# Altium schematic symbol library 724452_RPL-HX_Mobile_AEP_Rev0p91_Library.SchLib: 162 symbols (part 1 of 5)
Pins are listed as number, name and electrical type; pins without a type are passive.

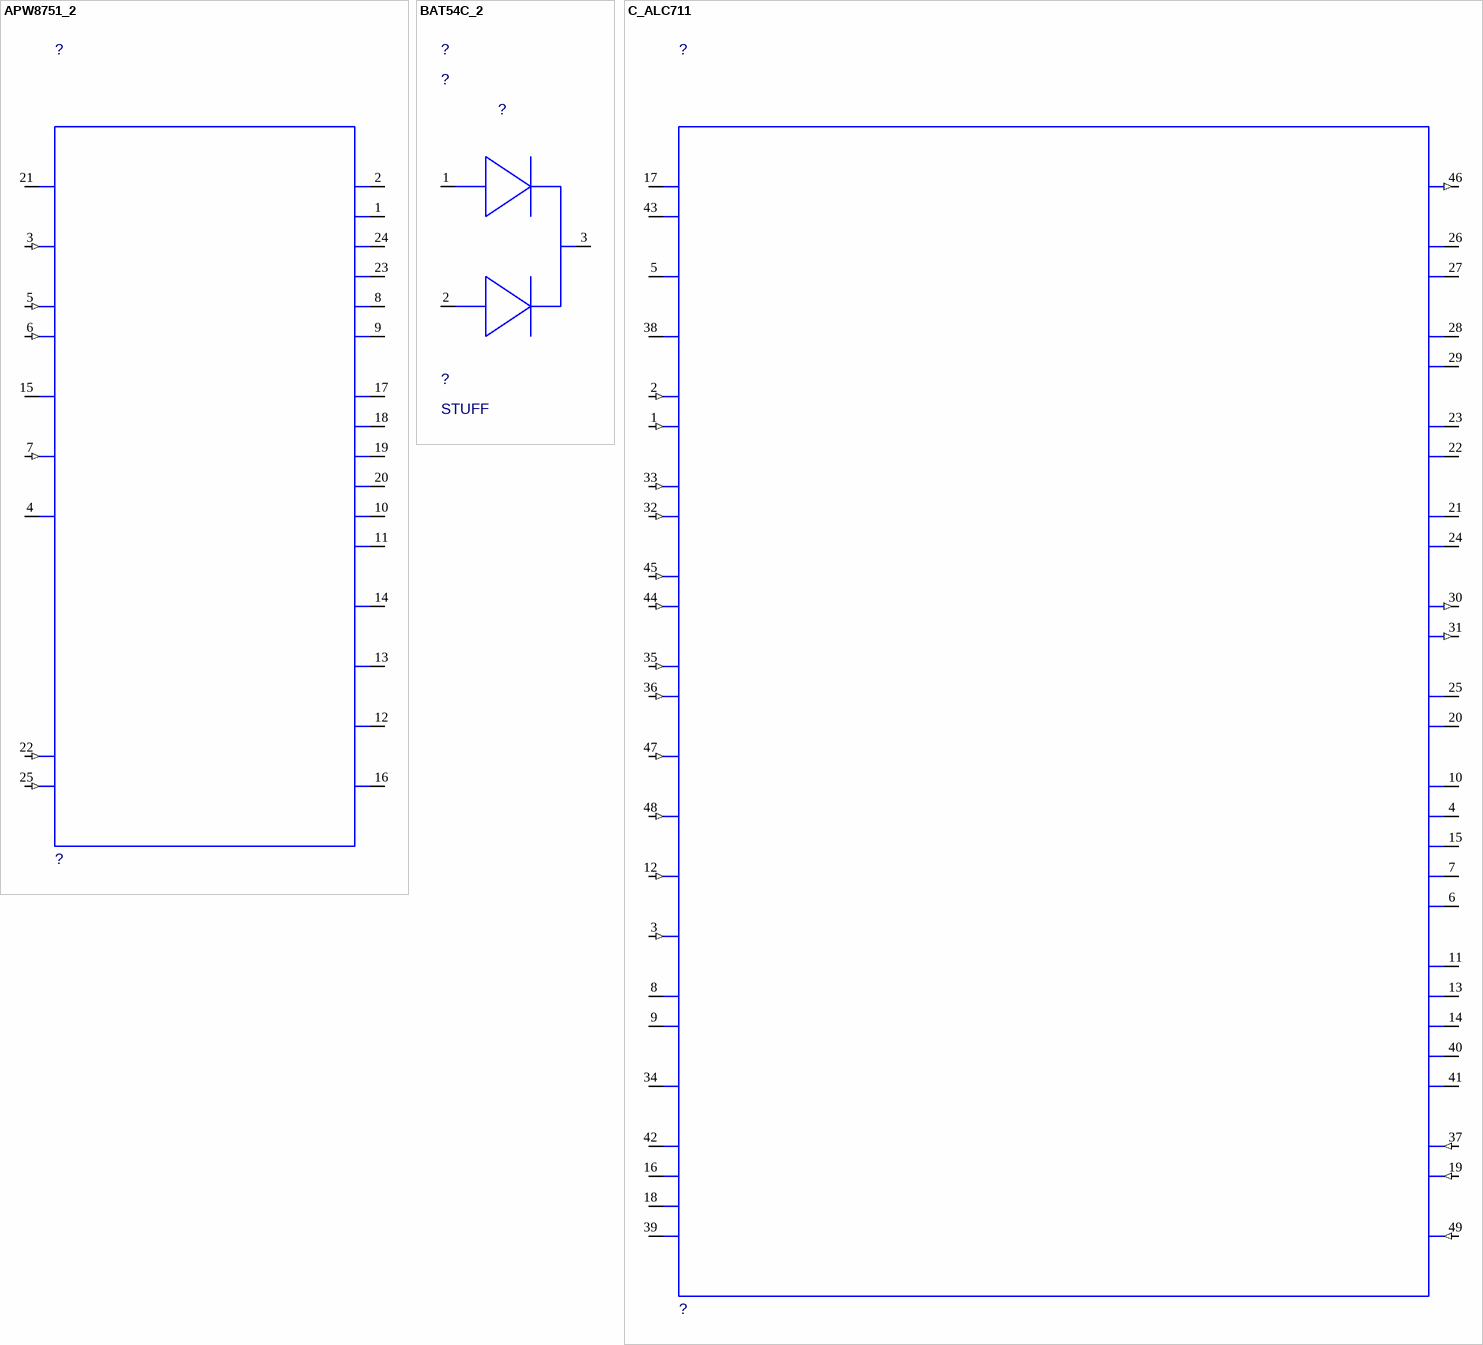
[diagram p0: symbols APW8751_2 to C_ALC711]

## APW8751_2
designator ?  (value not drawn)
CDS_LMAN_SYM_OUTLINE: -250,600,250,-600; ROOM: NONE; OriginalSymbolOrigin: (-275,600); FP_TECH: ?; IP: ?; PACK_TYPE: ?; VARIANT: ?; MATERIAL: ?; PART_NUMBER: ?
pins: 1 BOOT1 (io), 2 UGATE1 (io), 3 EN (in), 4 PSI (io), 5 VID1 (in), 6 VID0 (in), 7 FS (in), 8 CSP1 (io), 9 CSN1 (io), 10 CSP2 (io), 11 CSN2 (io), 12 GNDSNS (io), 13 VSNS (io), 14 VDROOP (io), 15 COMP (io), 16 POK (io), 17 UGATE2 (io), 18 BOOT2 (io), 19 PHASE2 (io), 20 LGATE2 (io), 21 VCC (power), 22 GND (in), 23 LGATE1 (io), 24 PHASE1 (io), 25 PGND_TPD (in)

## BAT54C_2
designator ?, comment ?  BOM_USE: STUFF
CDS_LMAN_SYM_OUTLINE: -100,150,50,-150; ROOM: NONE; OriginalSymbolOrigin: (-125,150); CURRENT: ?; FP_TECH: ?; IP: ?; MATERIAL: ?; PACK_TYPE: ?; PART_NUMBER: ?; VARIANT: ?
pins: 1 A1 (io), 2 A2 (io), 3 C (io)

## C_ALC711
designator ?  (value not drawn)
CDS_LMAN_SYM_OUTLINE: -650,1000,600,-950; ROOM: NONE; OriginalSymbolOrigin: (-675,1000); FP_TECH: ?; IP: ?; MATERIAL: ?; PACK_TYPE: ?; PART_NUMBER: ?; VARIANT: ?
pins: 1 CC1 (in), 2 CC2 (in), 3 RTCLK (in), 4 GPIO3 (io), 5 DVDD (power), 6 GPIO0_DMIC_DATA12 (io), 7 GPIO1_DMIC_CLK (io), 8 SDW_DAT (io), 9 SDW_CLK (io), 10 SCP_ID0_GPIO4 (io), 11 NC_1 (io), 12 SCP_ID1 (in), 13 NC_2 (io), 14 NC_3 (io), 15 GPIO2_DMIC_DATA34 (io), 16 LDO3_CAP (io), 17 AVDD2 (power), 18 LDO2_CAP (io), 19 AVSS2 (in), 20 CPVEE (io), 21 CBP (io), 22 CBN2 (io), 23 CBP2 (io), 24 CBN (io), 25 CPVPP (io), 26 HPOUT_R_PORT_I_R (io), 27 HPOUT_L_PORT_I_L (io), 28 USB_DP_IN (io), 29 USB_DN_IN (io), 30 MIC2_VREFO_L (out), 31 MIC2_VREFO_R (out), 32 RING2_MIC2_L_PORT_F_L (in), 33 SLEEVE_MIC2_R_PORT_F_R (in), 34 MIC2_CAP (io), 35 LINE1_R_PORT_C_R (in), 36 LINE1_L_PORT_C_L (in), 37 AVSS1 (in), 38 VREF (io), 39 LDO1_CAP (io), 40 NC_4 (io), 41 NC_5 (io), 42 LDO4_CAP (io), 43 AVDD1 (power), 44 LINE2_L_PORT_E_L (in), 45 LINE2_R_PORT_E_R (in), 46 LINE2_VREFO (out), 47 LINE2_JD (in), 48 AGPI (in), 49 DGND_TPD (in)

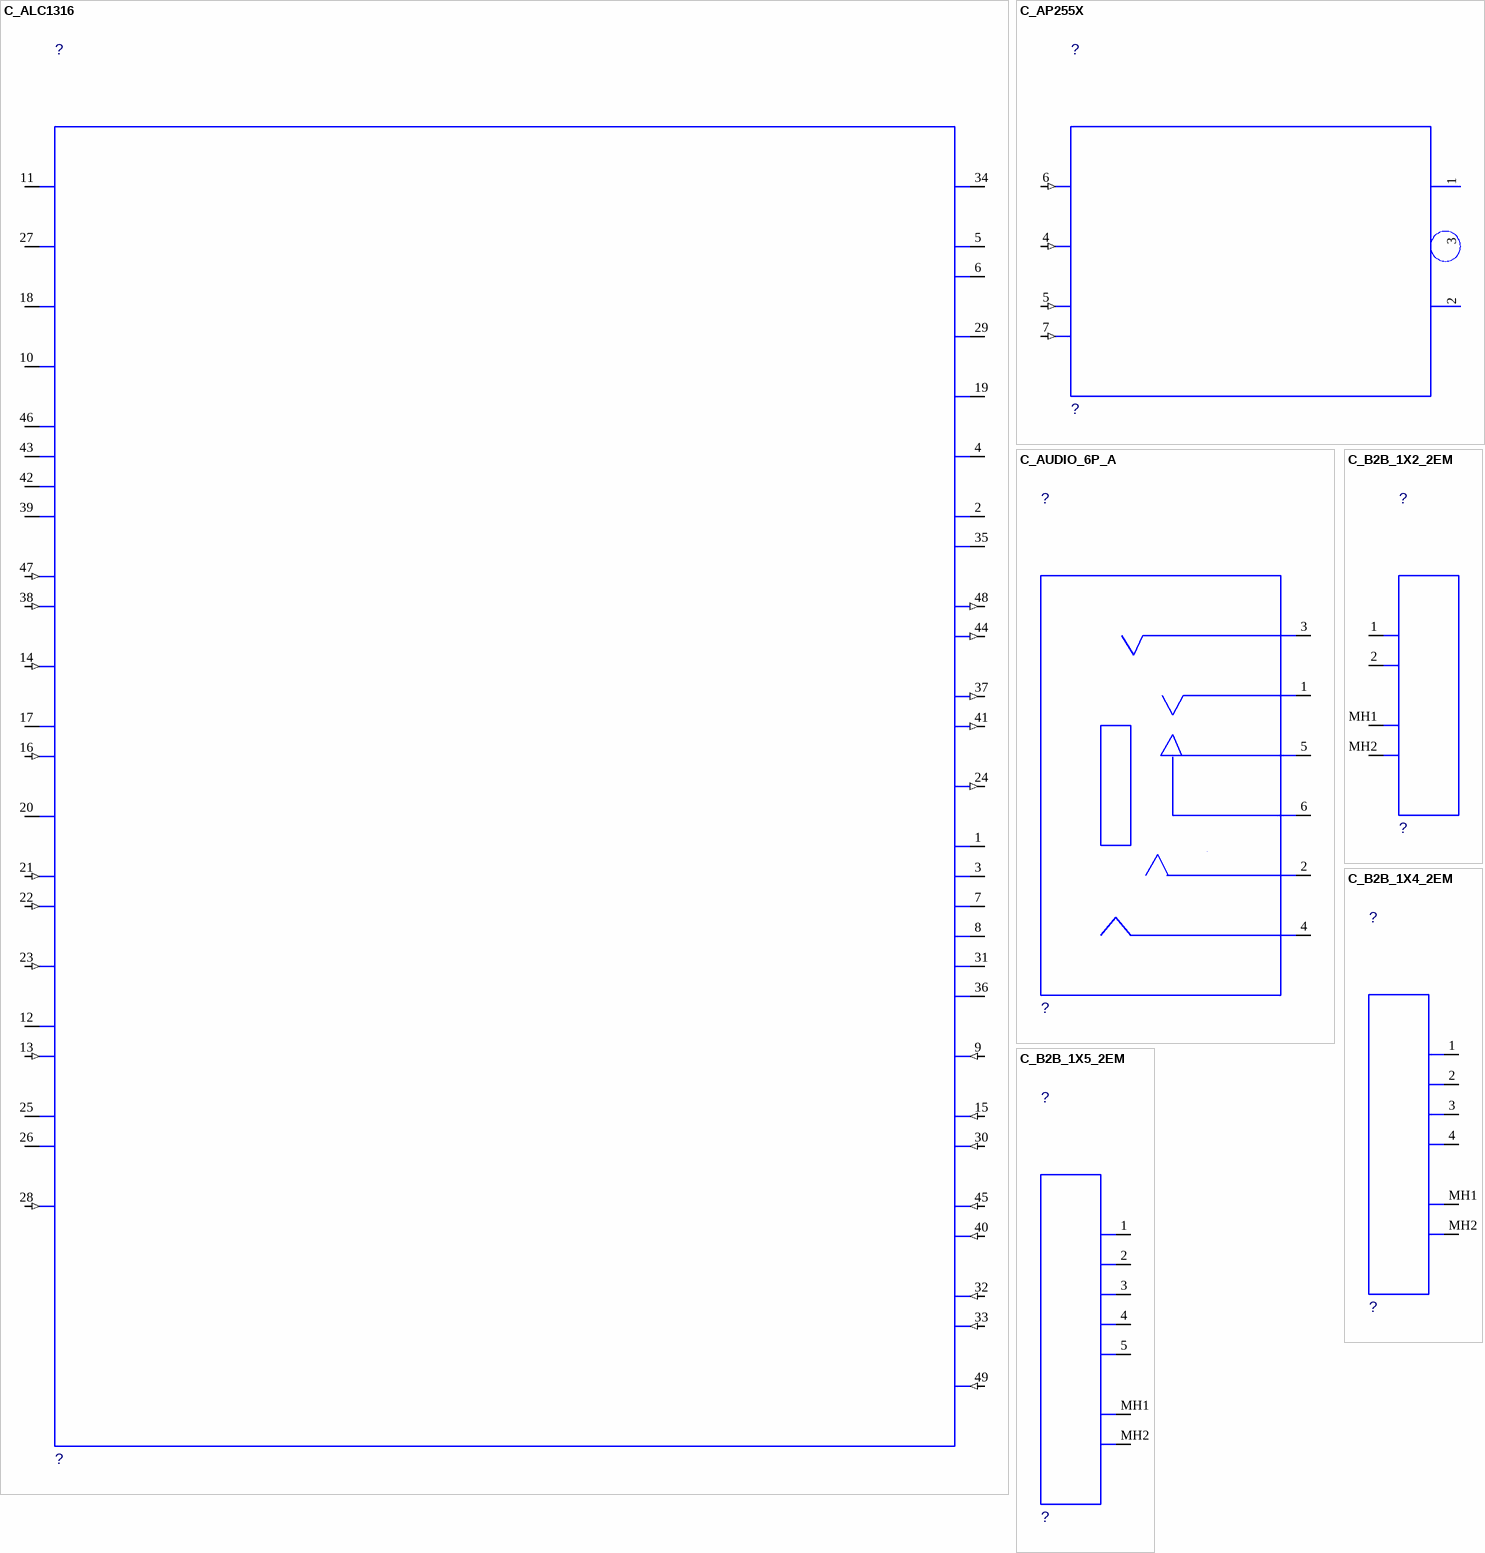
[diagram p1: symbols C_ALC1316 to C_B2B_1X5_2EM]

## C_ALC1316
designator ?  (value not drawn)
CDS_LMAN_SYM_OUTLINE: -750,1100,750,-1100; ROOM: NONE; OriginalSymbolOrigin: (-775,1100); FP_TECH: ?; IP: ?; MATERIAL: ?; PACK_TYPE: ?; PART_NUMBER: ?; VARIANT: ?
pins: 1 NC_1 (io), 2 PVDD_AB (power), 3 NC_2 (io), 4 GVDD_OUT (power), 5 AVDD_5 (power), 6 AVDD_33 (power), 7 NC_3 (io), 8 NC_4 (io), 9 AGND (in), 10 HV_45_CAP (power), 11 VREF (power), 12 SDA (io), 13 SCL (in), 14 PDB (in), 15 DGND (in), 16 SDW_CLK (in), 17 SDW_DAT (io), 18 SDW_IO_18 (power), 19 DVDD_IO (power), 20 MCLK_SDW_TOH_MODE_VI_DAT_SYNC (io), 21 LRCK_SDW_TOH1 (in), 22 BCLK_SDW_TOH0 (in), 23 DACDAT_SDW_SR1 (in), 24 ADCDAT_SDW_SR0 (out), 25 ASEL0_VI_DAT_SYNC (io), 26 ASEL1 (io), 27 D_REG_18 (power), 28 MULTI_SPK (in), 29 DVDD_33 (power), 30 DGND_LV (in), 31 NC_5 (io), 32 VSS_SUB (in), 33 VSS_ANA (in), 34 AVCC (power), 35 PVDD_CD (power), 36 NC_6 (io), 37 OUTD_P_LCH (out), 38 L_ISENSE (in), 39 BST_D (power), 40 PGND_CD (in), 41 OUTC_N_LCH (out), 42 BST_C (power), 43 BST_B (power), 44 OUTB_N_RCH (out), 45 PGND_AB (in), 46 BST_A (power), 47 R_ISENSE (in), 48 OUTA_P_RCH (out), 49 GND_TPD (in)

## C_AP255X
designator ?  (value not drawn)
CDS_LMAN_SYM_OUTLINE: -300,250,300,-200; ROOM: NONE; OriginalSymbolOrigin: (-325,250); FP_TECH: ?; IP: ?; MATERIAL: ?; PACK_TYPE: ?; PART_NUMBER: ?; VARIANT: ?
pins: 1 OUT (out), 2 ILIM (out), 3 FAULT_N (out), 4 EN_N_EN (in), 5 GND (in), 6 IN (in), 7 GND_TPD (in)

## C_AUDIO_6P_A
designator ?  (value not drawn)
CDS_LMAN_SYM_OUTLINE: -200,350,200,-350; ROOM: NONE; OriginalSymbolOrigin: (-200,350); FP_TECH: ?; IP: ?; MATERIAL: ?; PACK_TYPE: ?; PART_NUMBER: ?; VARIANT: ?
pins: 1 L_R (io), 2 R_L (io), 3 G_M (io), 4 M_G (io), 5 GND_1 (io), 6 GND_2 (io)

## C_B2B_1X2_2EM
designator ?  (value not drawn)
CDS_LMAN_SYM_OUTLINE: -50,200,50,-200; ROOM: NONE; OriginalSymbolOrigin: (-75,200); FP_TECH: ?; IP: ?; PACK_TYPE: ?; VARIANT: ?; MATERIAL: ?; PART_NUMBER: ?
pins: 1 IO1 (io), 2 IO2 (io), MH1 (io), MH2 (io)

## C_B2B_1X4_2EM
designator ?  (value not drawn)
CDS_LMAN_SYM_OUTLINE: -50,250,50,-250; ROOM: NONE; OriginalSymbolOrigin: (-50,250); FP_TECH: ?; IP: ?; MATERIAL: ?; PACK_TYPE: ?; PART_NUMBER: ?; VARIANT: ?
pins: 1 IO1 (io), 2 IO2 (io), 3 IO3 (io), 4 IO4 (io), MH1 (io), MH2 (io)

## C_B2B_1X5_2EM
designator ?  (value not drawn)
CDS_LMAN_SYM_OUTLINE: -50,300,50,-250; ROOM: NONE; OriginalSymbolOrigin: (-50,300); FP_TECH: ?; IP: ?; MATERIAL: ?; PACK_TYPE: ?; PART_NUMBER: ?; VARIANT: ?
pins: 1 IO1 (io), 2 IO2 (io), 3 IO3 (io), 4 IO4 (io), 5 IO5 (io), MH1 (io), MH2 (io)

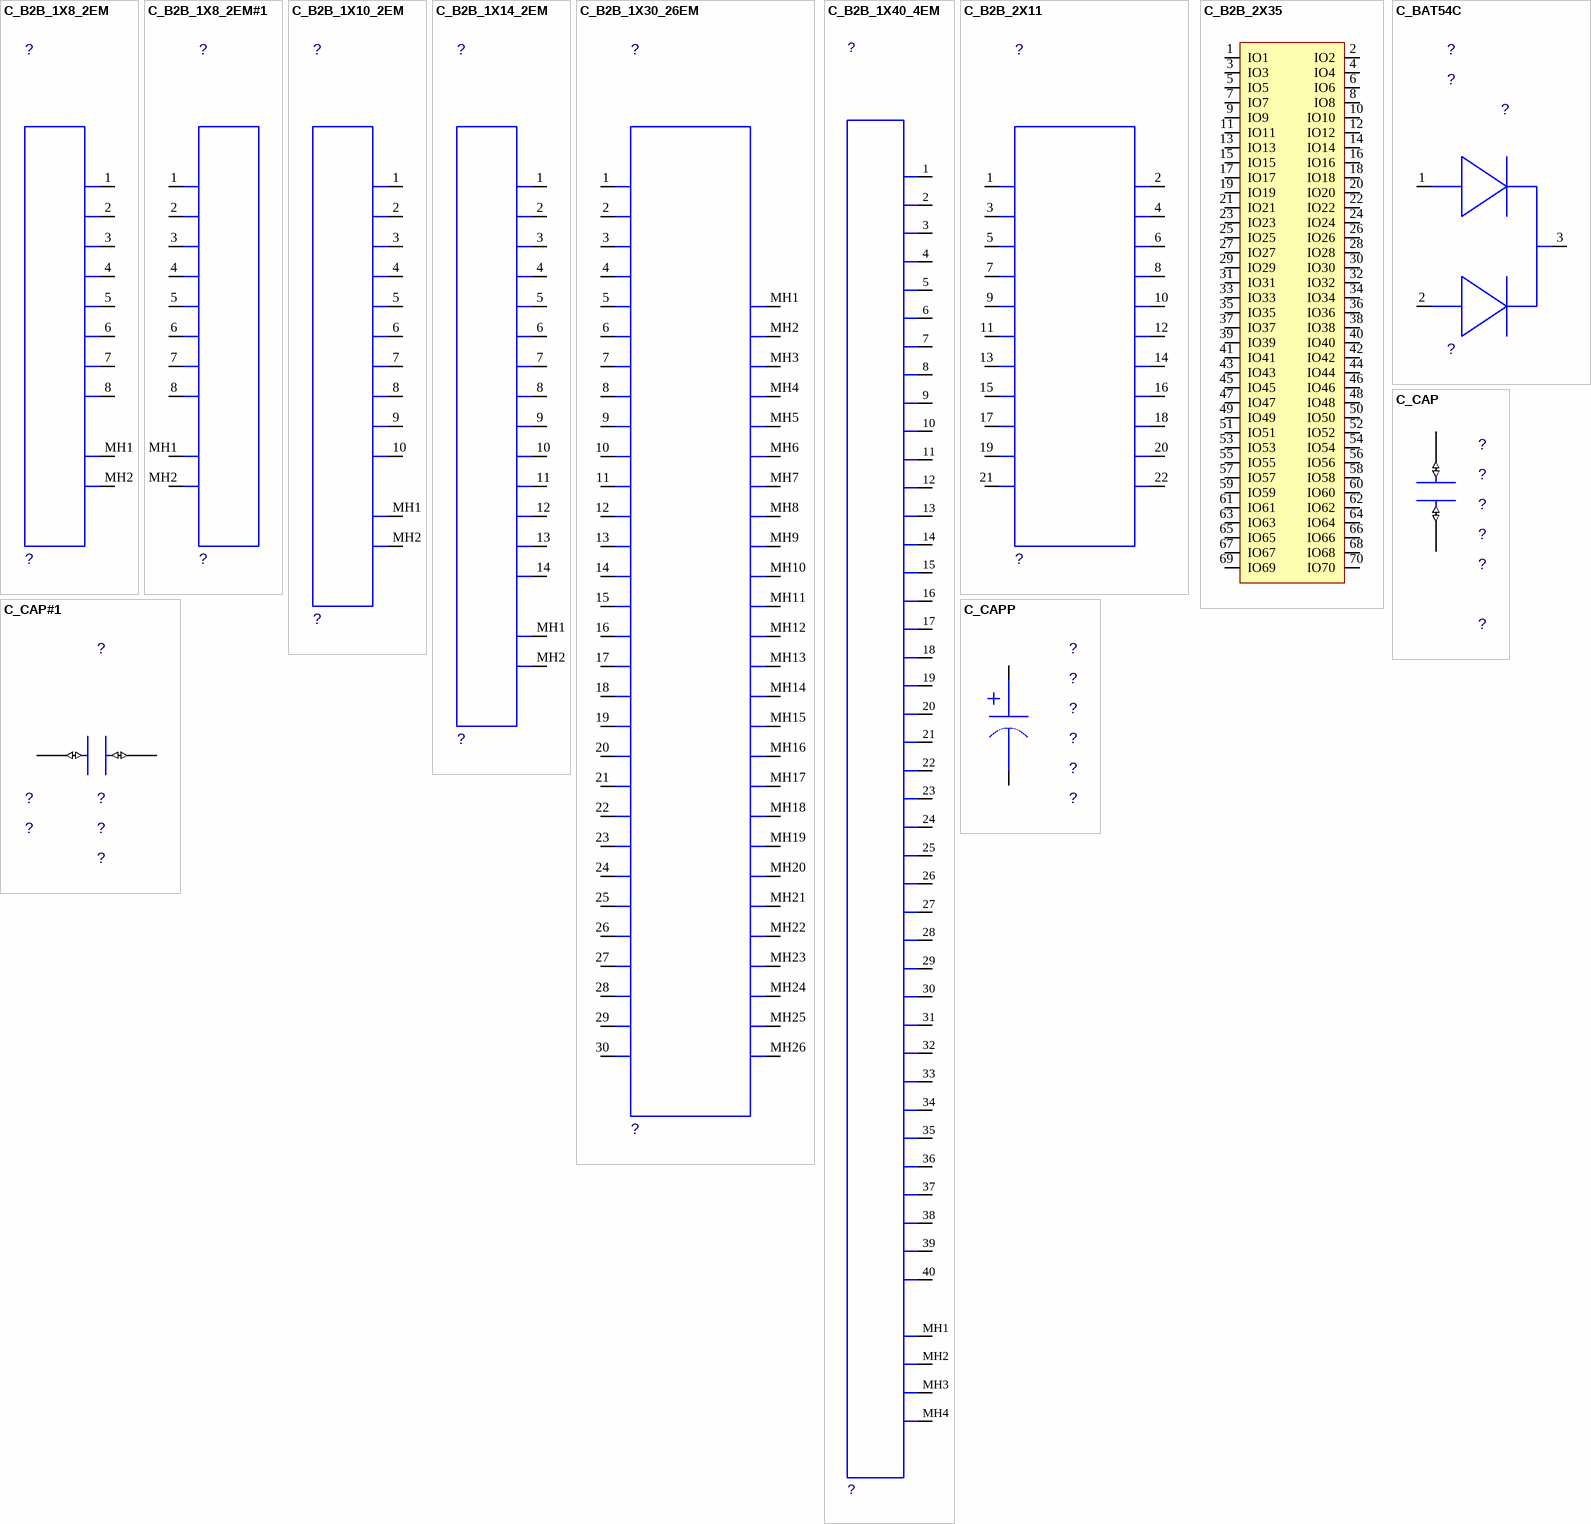
[diagram p2: symbols C_B2B_1X8_2EM to C_CAPP]

## C_B2B_1X8_2EM
designator ?  (value not drawn)
CDS_LMAN_SYM_OUTLINE: -50,350,50,-350; ROOM: NONE; OriginalSymbolOrigin: (-50,350); FP_TECH: ?; IP: ?; MATERIAL: ?; PACK_TYPE: ?; PART_NUMBER: ?; VARIANT: ?
pins: 1 IO1 (io), 2 IO2 (io), 3 IO3 (io), 4 IO4 (io), 5 IO5 (io), 6 IO6 (io), 7 IO7 (io), 8 IO8 (io), MH1 (io), MH2 (io)

## C_B2B_1X8_2EM#1
designator ?, comment C_B2B_1X8_2EM  (value not drawn)
CDS_LMAN_SYM_OUTLINE: -50,350,50,-350; ROOM: NONE; OriginalSymbolOrigin: (-75,350); FP_TECH: ?; IP: ?; MATERIAL: ?; PACK_TYPE: ?; PART_NUMBER: ?; VARIANT: ?
pins: 1 IO1 (io), 2 IO2 (io), 3 IO3 (io), 4 IO4 (io), 5 IO5 (io), 6 IO6 (io), 7 IO7 (io), 8 IO8 (io), MH1 (io), MH2 (io)

## C_B2B_1X10_2EM
designator ?  (value not drawn)
CDS_LMAN_SYM_OUTLINE: -50,400,50,-400; ROOM: NONE; OriginalSymbolOrigin: (-50,400); FP_TECH: ?; IP: ?; MATERIAL: ?; PACK_TYPE: ?; PART_NUMBER: ?; VARIANT: ?
pins: 1 IO1 (io), 2 IO2 (io), 3 IO3 (io), 4 IO4 (io), 5 IO5 (io), 6 IO6 (io), 7 IO7 (io), 8 IO8 (io), 9 IO9 (io), 10 IO10 (io), MH1 (io), MH2 (io)

## C_B2B_1X14_2EM
designator ?  (value not drawn)
CDS_LMAN_SYM_OUTLINE: -50,500,50,-500; ROOM: NONE; OriginalSymbolOrigin: (-50,500); FP_TECH: ?; IP: ?; MATERIAL: ?; PACK_TYPE: ?; PART_NUMBER: ?; VARIANT: ?
pins: 1 IO1 (io), 2 IO2 (io), 3 IO3 (io), 4 IO4 (io), 5 IO5 (io), 6 IO6 (io), 7 IO7 (io), 8 IO8 (io), 9 IO9 (io), 10 IO10 (io), 11 IO11 (io), 12 IO12 (io), 13 IO13 (io), 14 IO14 (io), MH1 (io), MH2 (io)

## C_B2B_1X30_26EM
designator ?  (value not drawn)
CDS_LMAN_SYM_OUTLINE: -100,800,100,-850; ROOM: NONE; OriginalSymbolOrigin: (-125,800); FP_TECH: ?; IP: ?; MATERIAL: ?; PACK_TYPE: ?; PART_NUMBER: ?; VARIANT: ?
pins: 1 IO1 (io), 2 IO2 (io), 3 IO3 (io), 4 IO4 (io), 5 IO5 (io), 6 IO6 (io), 7 IO7 (io), 8 IO8 (io), 9 IO9 (io), 10 IO10 (io), 11 IO11 (io), 12 IO12 (io), 13 IO13 (io), 14 IO14 (io), 15 IO15 (io), 16 IO16 (io), 17 IO17 (io), 18 IO18 (io), 19 IO19 (io), 20 IO20 (io), 21 IO21 (io), 22 IO22 (io), 23 IO23 (io), 24 IO24 (io), 25 IO25 (io), 26 IO26 (io), 27 IO27 (io), 28 IO28 (io), 29 IO29 (io), 30 IO30 (io), MH1 (io), MH2 (io), MH3 (io), MH4 (io), MH5 (io), MH6 (io), MH7 (io), MH8 (io), MH9 (io), MH10 (io), MH11 (io), MH12 (io), MH13 (io), MH14 (io), MH15 (io), MH16 (io), MH17 (io), MH18 (io), MH19 (io), MH20 (io), MH21 (io), MH22 (io), MH23 (io), MH24 (io), MH25 (io), MH26 (io)

## C_B2B_1X40_4EM
designator ?  (value not drawn)
CDS_LMAN_SYM_OUTLINE: -50,1200,50,-1200; ROOM: NONE; OriginalSymbolOrigin: (-50,1200); FP_TECH: ?; IP: ?; MATERIAL: ?; PACK_TYPE: ?; PART_NUMBER: ?; VARIANT: ?
pins: 1 IO1 (io), 2 IO2 (io), 3 IO3 (io), 4 IO4 (io), 5 IO5 (io), 6 IO6 (io), 7 IO7 (io), 8 IO8 (io), 9 IO9 (io), 10 IO10 (io), 11 IO11 (io), 12 IO12 (io), 13 IO13 (io), 14 IO14 (io), 15 IO15 (io), 16 IO16 (io), 17 IO17 (io), 18 IO18 (io), 19 IO19 (io), 20 IO20 (io), 21 IO21 (io), 22 IO22 (io), 23 IO23 (io), 24 IO24 (io), 25 IO25 (io), 26 IO26 (io), 27 IO27 (io), 28 IO28 (io), 29 IO29 (io), 30 IO30 (io), 31 IO31 (io), 32 IO32 (io), 33 IO33 (io), 34 IO34 (io), 35 IO35 (io), 36 IO36 (io), 37 IO37 (io), 38 IO38 (io), 39 IO39 (io), 40 IO40 (io), MH1 (io), MH2 (io), MH3 (io), MH4 (io)

## C_B2B_2X11
designator ?  (value not drawn)
CDS_LMAN_SYM_OUTLINE: -100,350,100,-350; ROOM: NONE; OriginalSymbolOrigin: (-125,350); FP_TECH: ?; IP: ?; MATERIAL: ?; PACK_TYPE: ?; PART_NUMBER: ?; VARIANT: ?
pins: 1 IO1 (io), 2 IO2 (io), 3 IO3 (io), 4 IO4 (io), 5 IO5 (io), 6 IO6 (io), 7 IO7 (io), 8 IO8 (io), 9 IO9 (io), 10 IO10 (io), 11 IO11 (io), 12 IO12 (io), 13 IO13 (io), 14 IO14 (io), 15 IO15 (io), 16 IO16 (io), 17 IO17 (io), 18 IO18 (io), 19 IO19 (io), 20 IO20 (io), 21 IO21 (io), 22 IO22 (io)

## C_B2B_2X35
designator ?  (value not drawn)
Manufacturer Part Number: *; Case/Package: *
pins: 1 IO1, 2 IO2, 3 IO3, 4 IO4, 5 IO5, 6 IO6, 7 IO7, 8 IO8, 9 IO9, 10 IO10, 11 IO11, 12 IO12, 13 IO13, 14 IO14, 15 IO15, 16 IO16, 17 IO17, 18 IO18, 19 IO19, 20 IO20, 21 IO21, 22 IO22, 23 IO23, 24 IO24, 25 IO25, 26 IO26, 27 IO27, 28 IO28, 29 IO29, 30 IO30, 31 IO31, 32 IO32, 33 IO33, 34 IO34, 35 IO35, 36 IO36, 37 IO37, 38 IO38, 39 IO39, 40 IO40, 41 IO41, 42 IO42, 43 IO43, 44 IO44, 45 IO45, 46 IO46, 47 IO47, 48 IO48, 49 IO49, 50 IO50, 51 IO51, 52 IO52, 53 IO53, 54 IO54, 55 IO55, 56 IO56, 57 IO57, 58 IO58, 59 IO59, 60 IO60, 61 IO61, 62 IO62, 63 IO63, 64 IO64, 65 IO65, 66 IO66, 67 IO67, 68 IO68, 69 IO69, 70 IO70

## C_BAT54C
designator ?, comment ?
CDS_LMAN_SYM_OUTLINE: -100,150,50,-150; ROOM: NONE; OriginalSymbolOrigin: (-125,150); CURRENT: ?; FP_TECH: ?; IP: ?; MATERIAL: ?; PACK_TYPE: ?; PART_NUMBER: ?; VARIANT: ?
pins: 1 A1 (io), 2 A2 (io), 3 C (io)

## C_CAP
designator ?, comment ?
CDS_LMAN_SYM_OUTLINE: -50,50,50,-50; ROOM: NONE; OriginalSymbolOrigin: (-50,25); FP_TECH: ?; IP: ?; MATERIAL: ?; PACK_TYPE: ?; PART_NUMBER: ?; TOLERANCE: ?; VARIANT: ?; VOLTAGE: ?
pins: 1 A (io), 2 B (io)

## C_CAP#1
designator ?, comment ?
CDS_LMAN_SYM_OUTLINE: -50,50,50,-50; ROOM: NONE; OriginalSymbolOrigin: (-25,50); FP_TECH: ?; IP: ?; MATERIAL: ?; PACK_TYPE: ?; PART_NUMBER: ?; TOLERANCE: ?; VARIANT: ?; VOLTAGE: ?
pins: 1 A (io), 2 B (io)

## C_CAPP
designator ?, comment ?
CDS_LMAN_SYM_OUTLINE: -50,100,50,-50; ROOM: NONE; OriginalSymbolOrigin: (-50,75); FP_TECH: ?; IP: ?; MATERIAL: ?; PACK_TYPE: ?; PART_NUMBER: ?; TOLERANCE: ?; VARIANT: ?; VOLTAGE: ?
pins: 1 A (io), 2 B (io)

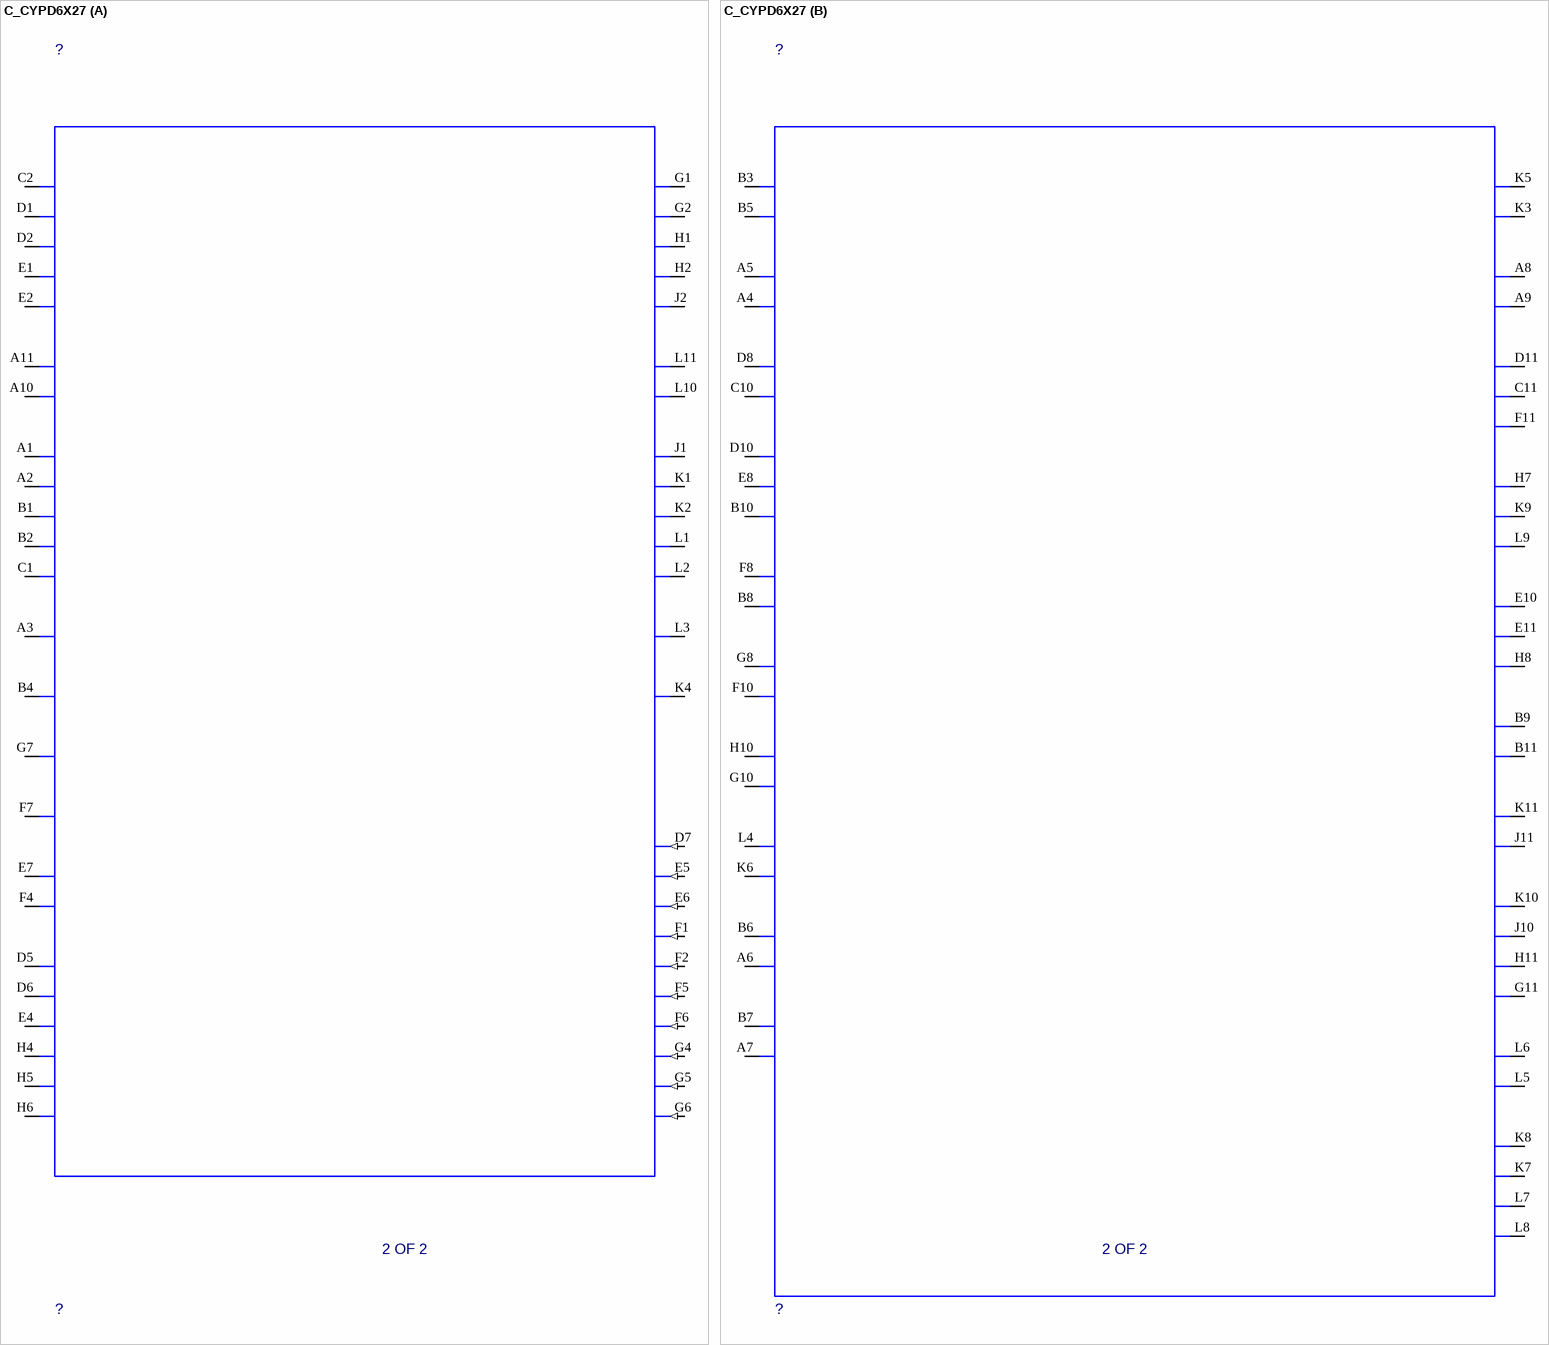
[diagram p3: symbol C_CYPD6X27]

## C_CYPD6X27
designator ?  PART_SYM_NUM: 2 OF 2  (hidden comment: C_CYPD6X27)
CDS_LMAN_SYM_OUTLINE: -600,1000,600,-950; ROOM: NONE; OriginalSymbolOrigin: (-625,1000); FP_TECH: ?; IP: ?; PACK_TYPE: ?; VARIANT: ?; MATERIAL: ?; PART_NUMBER: ?
part A pins: A1 VBUS_C_P0_1 (power), A2 VBUS_C_P0_2 (power), A3 VBUS_C_CTRL_P0 (power), A10 CSN_P0 (power), A11 CSP_P0 (power), B1 VBUS_C_P0_3 (power), B2 VBUS_C_P0_4 (power), B4 V5V_P0 (power), C1 VBUS_C_P0_5 (power), C2 VBUS_P_P0_1 (power), D1 VBUS_P_P0_2 (power), D2 VBUS_P_P0_3 (power), D5 DNU_1 (io), D6 DNU_2 (io), D7 VSSD_1 (in), E1 VBUS_P_P0_4 (power), E2 VBUS_P_P0_5 (power), E4 DNU_3 (io), E5 VSSD_2 (in), E6 VSSD_3 (in), E7 VCCD (power), F1 VSSD_4 (in), F2 VSSD_5 (in), F4 VSYS (power), F5 VSSD_6 (in), F6 VSSD_7 (in), F7 VDDIO (power), G1 VBUS_P_P1_1 (power), G2 VBUS_P_P1_2 (power), G4 VSSD_8 (in), G5 VSSD_9 (in), G6 VSSD_10 (in), G7 VDDD (power), H1 VBUS_P_P1_3 (power), H2 VBUS_P_P1_4 (power), H4 DNU_4 (io), H5 DNU_5 (io), H6 DNU_6 (io), J1 VBUS_C_P1_1 (power), J2 VBUS_P_P1_5 (power), K1 VBUS_C_P1_2 (power), K2 VBUS_C_P1_3 (power), K4 V5V_P1 (power), L1 VBUS_C_P1_4 (power), L2 VBUS_C_P1_5 (power), L3 VBUS_C_CTRL_P1 (power), L10 CSN_P1 (power), L11 CSP_P1 (power)
part B pins: A4 SBU2_P0 (io), A5 SBU1_P0 (io), A6 SBU2_SYS_P0 (io), A7 SBU2_SYS_P1 (io), A8 SBU1_P1 (io), A9 SBU2_P1 (io), B3 CC1_P0 (io), B5 CC2_P0 (io), B6 SBU1_SYS_P0 (io), B7 SBU1_SYS_P1 (io), B8 HPD_P1_P3P3 (io), B9 I2C_SCL_SCB3_P3P2 (io), B10 P3P0 (io), B11 I2C_SDA_SCB3_P3P1 (io), C10 XRES (io), C11 I2C_SDA_SCB0_P4P1 (io), D8 P2P5 (io), D10 P2P4 (io), D11 I2C_SCL_SCB0_P4P0 (io), E8 P2P3 (io), E10 I2C_SCL_SCB2_P2P2 (io), E11 I2C_SDA_SCB2_P2P1 (io), F8 HPD_P0_P2P0 (io), F10 SWD_CLK_P1P0 (io), F11 I2C_INT_EC_P1P2 (io), G8 SWD_IO_P1P1 (io), G10 UART_RX_P0_P1P3 (io), G11 DP_TOP_P0 (io), H7 I2C_SCL_SCB1_P0P3 (io), H8 I2C_INT_TBT_P1_P0P5 (io), H10 UART_TX_P0_P1P4 (io), H11 DM_TOP_P0 (io), J10 DM_BOT_P0 (io), J11 DM_SYS_P0 (io), K3 CC2_P1 (io), K5 CC1_P1 (io), K6 UART_RX_P1_P0P1 (io), K7 DM_BOT_P1 (io), K8 DP_BOT_P1 (io), K9 I2C_SDA_SCB1_P0P2 (io), K10 DP_BOT_P0 (io), K11 DP_SYS_P0 (io), L4 UART_TX_P1_P0P0 (io), L5 DM_SYS_P1 (io), L6 DP_SYS_P1 (io), L7 DM_TOP_P1 (io), L8 DP_TOP_P1 (io), L9 I2C_INT_TBT_P0_P0P4 (io)

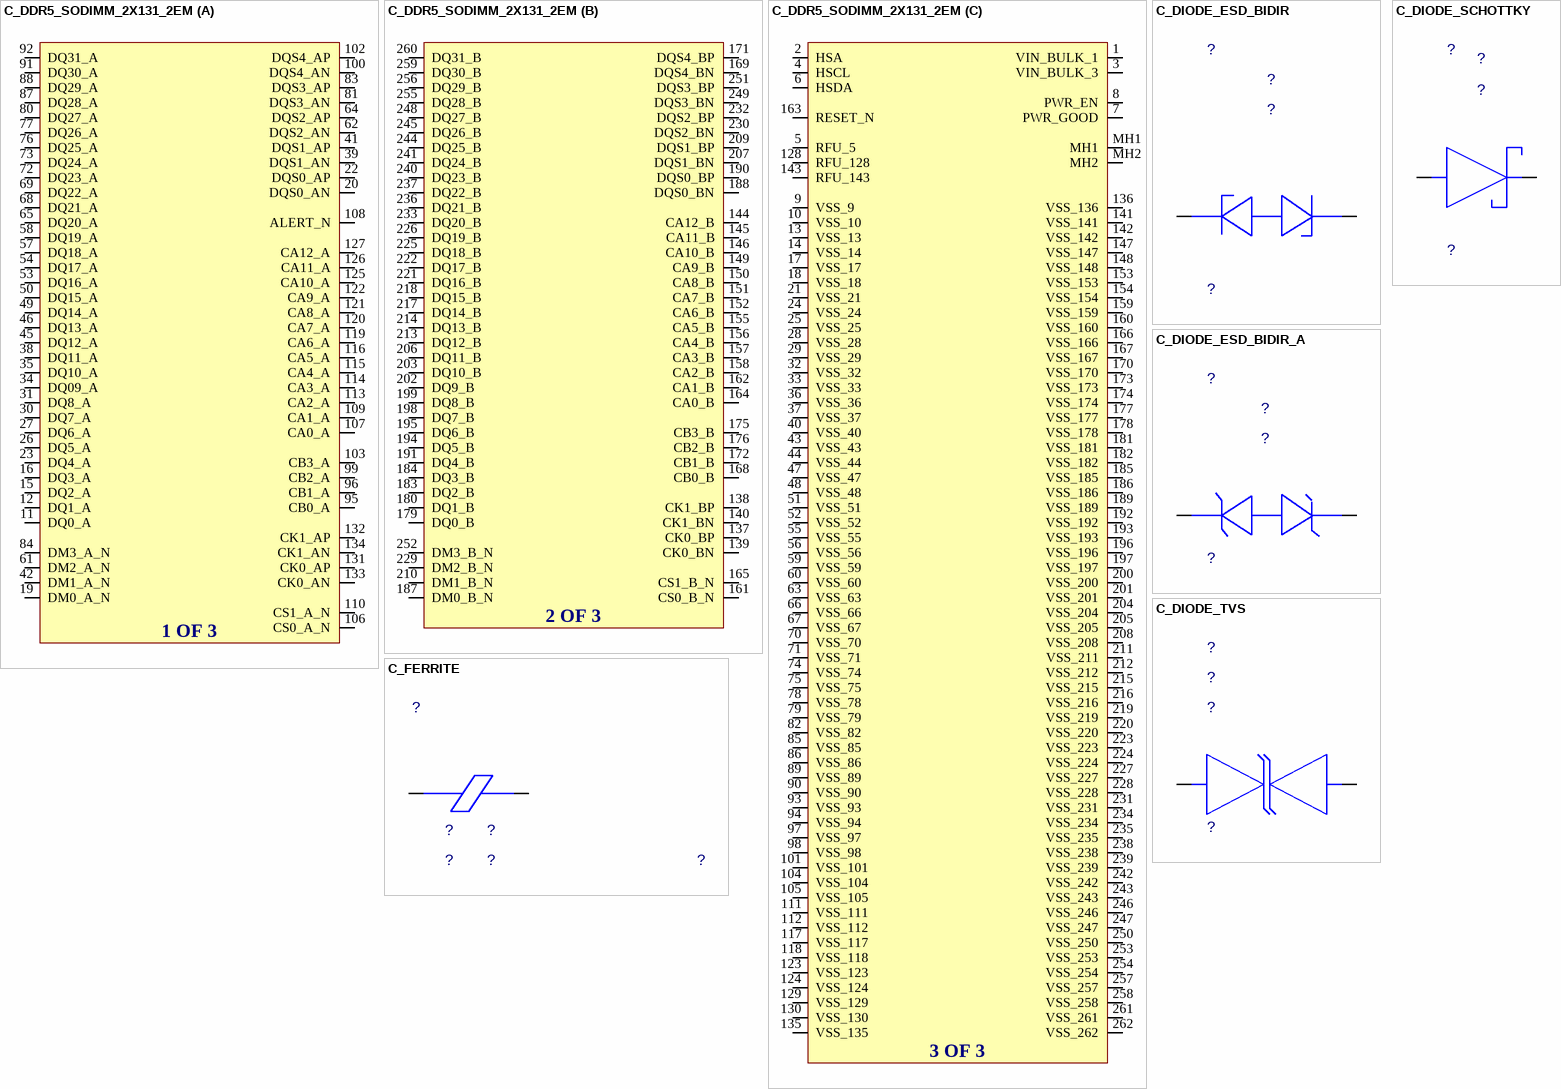
[diagram p4: symbols C_DDR5_SODIMM_2X131_2EM to C_FERRITE]

## C_DDR5_SODIMM_2X131_2EM
designator ?  (value not drawn)
Manufacturer Part Number: *; Case/Package: *
part A pins: 11 DQ0_A, 12 DQ1_A, 15 DQ2_A, 16 DQ3_A, 19 DM0_A_N, 20 DQS0_AN, 22 DQS0_AP, 23 DQ4_A, 26 DQ5_A, 27 DQ6_A, 30 DQ7_A, 31 DQ8_A, 34 DQ09_A, 35 DQ10_A, 38 DQ11_A, 39 DQS1_AN, 41 DQS1_AP, 42 DM1_A_N, 45 DQ12_A, 46 DQ13_A, 49 DQ14_A, 50 DQ15_A, 53 DQ16_A, 54 DQ17_A, 57 DQ18_A, 58 DQ19_A, 61 DM2_A_N, 62 DQS2_AN, 64 DQS2_AP, 65 DQ20_A, 68 DQ21_A, 69 DQ22_A, 72 DQ23_A, 73 DQ24_A, 76 DQ25_A, 77 DQ26_A, 80 DQ27_A, 81 DQS3_AN, 83 DQS3_AP, 84 DM3_A_N, 87 DQ28_A, 88 DQ29_A, 91 DQ30_A, 92 DQ31_A, 95 CB0_A, 96 CB1_A, 99 CB2_A, 100 DQS4_AN, 102 DQS4_AP, 103 CB3_A, 106 CS0_A_N, 107 CA0_A, 108 ALERT_N, 109 CA1_A, 110 CS1_A_N, 113 CA2_A, 114 CA3_A, 115 CA4_A, 116 CA5_A, 119 CA6_A, 120 CA7_A, 121 CA8_A, 122 CA9_A, 125 CA10_A, 126 CA11_A, 127 CA12_A, 131 CK0_AP, 132 CK1_AP, 133 CK0_AN, 134 CK1_AN
part B pins: 137 CK0_BP, 138 CK1_BP, 139 CK0_BN, 140 CK1_BN, 144 CA12_B, 145 CA11_B, 146 CA10_B, 149 CA9_B, 150 CA8_B, 151 CA7_B, 152 CA6_B, 155 CA5_B, 156 CA4_B, 157 CA3_B, 158 CA2_B, 161 CS0_B_N, 162 CA1_B, 164 CA0_B, 165 CS1_B_N, 168 CB0_B, 169 DQS4_BN, 171 DQS4_BP, 172 CB1_B, 175 CB3_B, 176 CB2_B, 179 DQ0_B, 180 DQ1_B, 183 DQ2_B, 184 DQ3_B, 187 DM0_B_N, 188 DQS0_BN, 190 DQS0_BP, 191 DQ4_B, 194 DQ5_B, 195 DQ6_B, 198 DQ7_B, 199 DQ8_B, 202 DQ9_B, 203 DQ10_B, 206 DQ11_B, 207 DQS1_BN, 209 DQS1_BP, 210 DM1_B_N, 213 DQ12_B, 214 DQ13_B, 217 DQ14_B, 218 DQ15_B, 221 DQ16_B, 222 DQ17_B, 225 DQ18_B, 226 DQ19_B, 229 DM2_B_N, 230 DQS2_BN, 232 DQS2_BP, 233 DQ20_B, 236 DQ21_B, 237 DQ22_B, 240 DQ23_B, 241 DQ24_B, 244 DQ25_B, 245 DQ26_B, 248 DQ27_B, 249 DQS3_BN, 251 DQS3_BP, 252 DM3_B_N, 255 DQ28_B, 256 DQ29_B, 259 DQ30_B, 260 DQ31_B
part C pins: 1 VIN_BULK_1, 2 HSA, 3 VIN_BULK_3, 4 HSCL, 5 RFU_5, 6 HSDA, 7 PWR_GOOD, 8 PWR_EN, 9 VSS_9, 10 VSS_10, 13 VSS_13, 14 VSS_14, 17 VSS_17, 18 VSS_18, 21 VSS_21, 24 VSS_24, 25 VSS_25, 28 VSS_28, 29 VSS_29, 32 VSS_32, 33 VSS_33, 36 VSS_36, 37 VSS_37, 40 VSS_40, 43 VSS_43, 44 VSS_44, 47 VSS_47, 48 VSS_48, 51 VSS_51, 52 VSS_52, 55 VSS_55, 56 VSS_56, 59 VSS_59, 60 VSS_60, 63 VSS_63, 66 VSS_66, 67 VSS_67, 70 VSS_70, 71 VSS_71, 74 VSS_74, 75 VSS_75, 78 VSS_78, 79 VSS_79, 82 VSS_82, 85 VSS_85, 86 VSS_86, 89 VSS_89, 90 VSS_90, 93 VSS_93, 94 VSS_94, 97 VSS_97, 98 VSS_98, 101 VSS_101, 104 VSS_104, 105 VSS_105, 111 VSS_111, 112 VSS_112, 117 VSS_117, 118 VSS_118, 123 VSS_123, 124 VSS_124, 128 RFU_128, 129 VSS_129, 130 VSS_130, 135 VSS_135, 136 VSS_136, 141 VSS_141, 142 VSS_142, 143 RFU_143, 147 VSS_147, 148 VSS_148, 153 VSS_153, 154 VSS_154, 159 VSS_159, 160 VSS_160, 163 RESET_N, 166 VSS_166, 167 VSS_167, 170 VSS_170, 173 VSS_173, 174 VSS_174, 177 VSS_177, 178 VSS_178, 181 VSS_181, 182 VSS_182, 185 VSS_185, 186 VSS_186, 189 VSS_189, 192 VSS_192, 193 VSS_193, 196 VSS_196, 197 VSS_197, 200 VSS_200, 201 VSS_201, 204 VSS_204, 205 VSS_205, 208 VSS_208, 211 VSS_211, 212 VSS_212, 215 VSS_215, 216 VSS_216, 219 VSS_219, 220 VSS_220, 223 VSS_223, 224 VSS_224, 227 VSS_227, 228 VSS_228, 231 VSS_231, 234 VSS_234, 235 VSS_235, 238 VSS_238, 239 VSS_239, 242 VSS_242, 243 VSS_243, 246 VSS_246, 247 VSS_247, 250 VSS_250, 253 VSS_253, 254 VSS_254, 257 VSS_257, 258 VSS_258, 261 VSS_261, 262 VSS_262, MH1, MH2
part A text: 1 OF 3
part B text: 2 OF 3
part C text: 3 OF 3

## C_DIODE_ESD_BIDIR
designator ?, comment ?
CDS_LMAN_SYM_OUTLINE: -100,50,100,-50; ROOM: NONE; OriginalSymbolOrigin: (-125,50); CURRENT: ?; FP_TECH: ?; IP: ?; MATERIAL: ?; PACK_TYPE: ?; PART_NUMBER: ?; VARIANT: ?
pins: 1 K1 (io), 2 K2 (io)

## C_DIODE_ESD_BIDIR_A
designator ?, comment ?
CDS_LMAN_SYM_OUTLINE: -100,50,100,-50; ROOM: NONE; OriginalSymbolOrigin: (-125,50); CURRENT: ?; FP_TECH: ?; IP: ?; MATERIAL: ?; PACK_TYPE: ?; PART_NUMBER: ?; VARIANT: ?
pins: 1 K1 (io), 2 K2 (io)

## C_DIODE_SCHOTTKY
designator ?, comment ?
CDS_LMAN_SYM_OUTLINE: -50,100,50,-100; ROOM: NONE; OriginalSymbolOrigin: (-75,50); CURRENT: ?; FP_TECH: ?; IP: ?; MATERIAL: ?; PACK_TYPE: ?; PART_NUMBER: ?; VARIANT: ?
pins: A ANODE (io), C CATHODE (io)

## C_DIODE_TVS
designator ?, comment ?
CDS_LMAN_SYM_OUTLINE: -100,50,100,-50; ROOM: NONE; OriginalSymbolOrigin: (-125,50); CURRENT: ?; FP_TECH: ?; IP: ?; MATERIAL: ?; PACK_TYPE: ?; PART_NUMBER: ?; VARIANT: ?
pins: 1 A1 (io), 2 A2 (io)

## C_FERRITE
designator ?, comment ?
CDS_LMAN_SYM_OUTLINE: -50,50,50,-50; ROOM: NONE; OriginalSymbolOrigin: (-75,50); CURRENT: ?; FP_TECH: ?; IP: ?; MATERIAL: ?; PACK_TYPE: ?; PART_NUMBER: ?; TOLERANCE: ?; VARIANT: ?
pins: 1 A (io), 2 B (io)
